# Altium footprint library MH_DA_THU_VIEN_16122016.PcbLib: 531 footprints (part 28 of 34)
Each footprint in its own frame and in the unit in brackets; x right, y up, seen from the top. Pads: shape width x height; smd on the part's side, far side on the other; paste and mask are expansions set on the pad; w line width, h text height; cw(c..) or ccw(c..) is an arc to the next point about the centre after c.
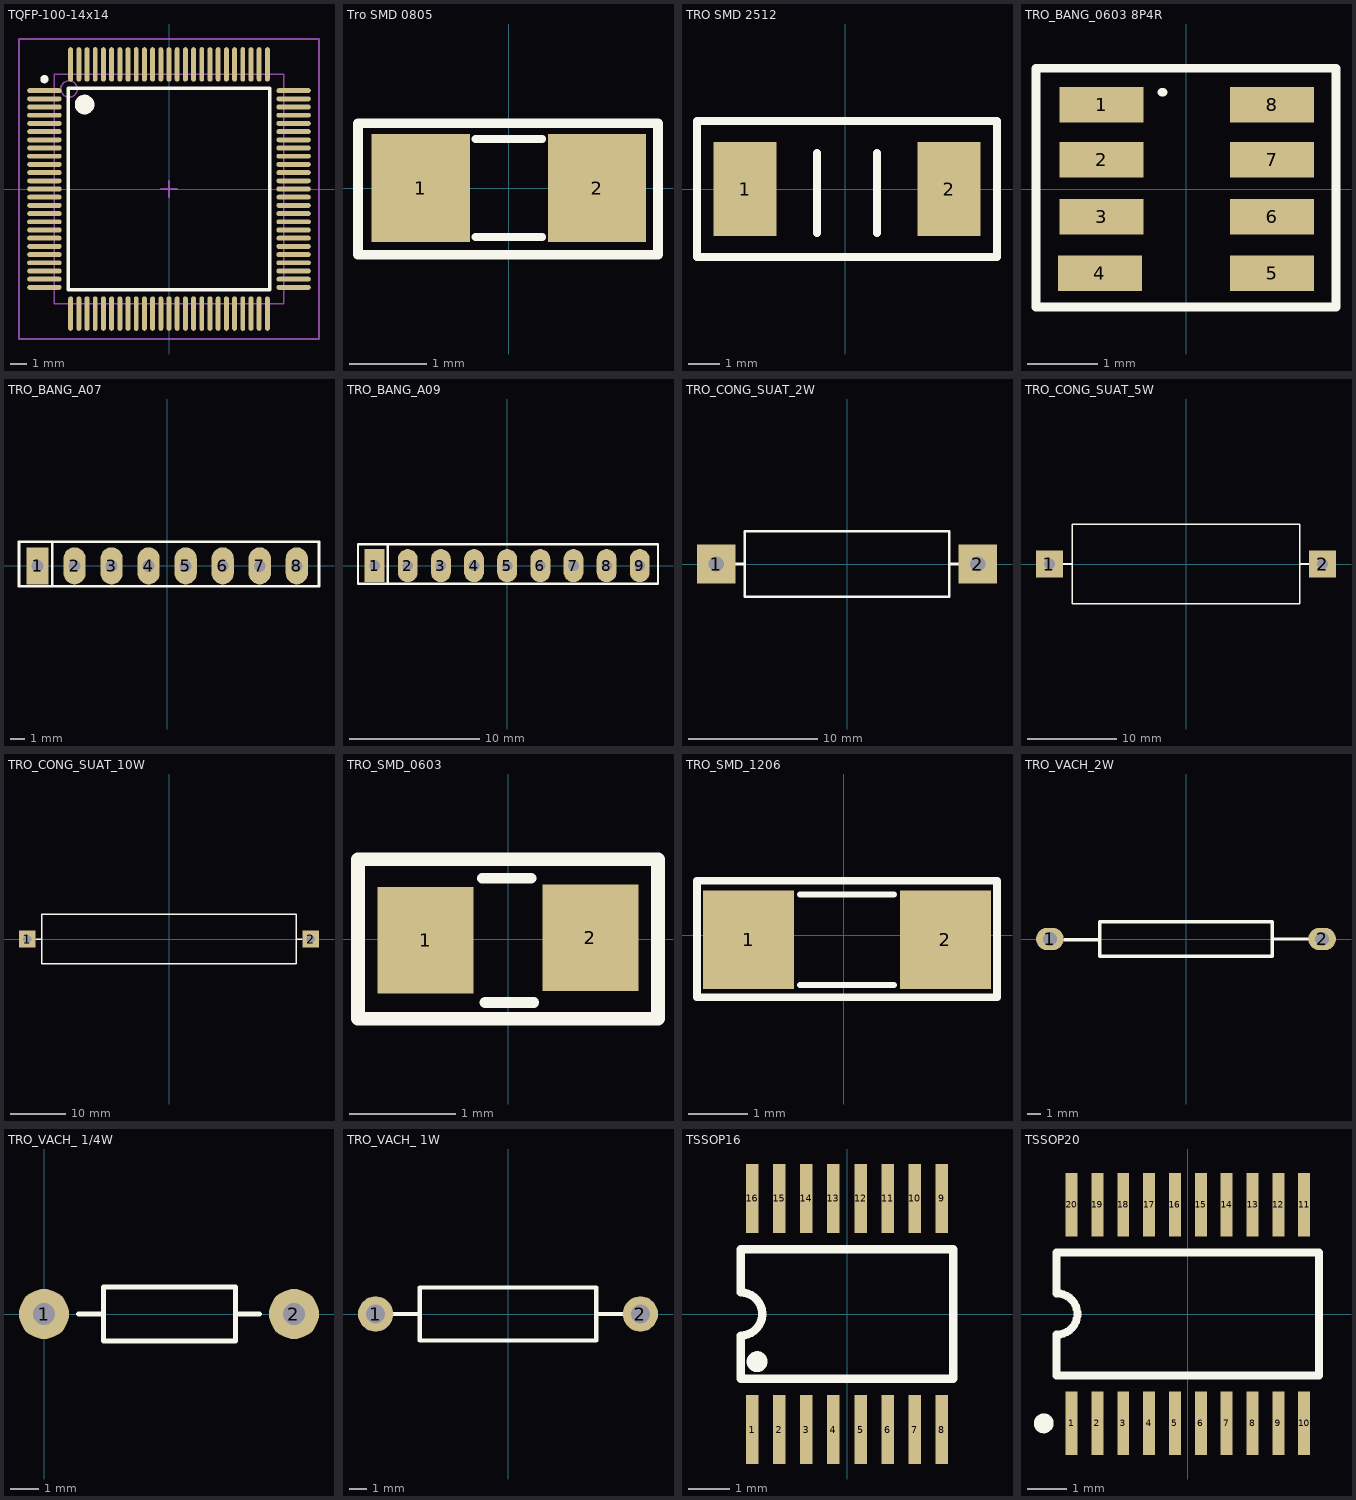
[diagram p27: the footprints below, top view; thin cyan lines are the x and y axes]

## TQFP-100-14x14 [mm] "Thin QFP, 100-Leads, Body 14x14mm, Pitch 0.5mm, IPC Low Density"
height 1.6
pads (100):
  oval 2.1x0.3 smd: 1(-7.6,6) 2(-7.6,5.5) 3(-7.6,5) 4(-7.6,4.5) 5(-7.6,4) 6(-7.6,3.5) 7(-7.6,3) 8(-7.6,2.5) 9(-7.6,2) 10(-7.6,1.5) 11(-7.6,1) 12(-7.6,0.5) 13(-7.6,0) 14(-7.6,-0.5) 15(-7.6,-1) 16(-7.6,-1.5) 17(-7.6,-2) 18(-7.6,-2.5) 19(-7.6,-3) 20(-7.6,-3.5) 21(-7.6,-4) 22(-7.6,-4.5) 23(-7.6,-5) 24(-7.6,-5.5) 25(-7.6,-6) 51(7.6,-6) 52(7.6,-5.5) 53(7.6,-5) 54(7.6,-4.5) 55(7.6,-4) 56(7.6,-3.5) 57(7.6,-3) 58(7.6,-2.5) 59(7.6,-2) 60(7.6,-1.5) 61(7.6,-1) 62(7.6,-0.5) 63(7.6,0) 64(7.6,0.5) 65(7.6,1) 66(7.6,1.5) 67(7.6,2) 68(7.6,2.5) 69(7.6,3) 70(7.6,3.5) 71(7.6,4) 72(7.6,4.5) 73(7.6,5) 74(7.6,5.5) 75(7.6,6)
  oval 0.3x2.1 smd: 26(-6,-7.6) 27(-5.5,-7.6) 28(-5,-7.6) 29(-4.5,-7.6) 30(-4,-7.6) 31(-3.5,-7.6) 32(-3,-7.6) 33(-2.5,-7.6) 34(-2,-7.6) 35(-1.5,-7.6) 36(-1,-7.6) 37(-0.5,-7.6) 38(0,-7.6) 39(0.5,-7.6) 40(1,-7.6) 41(1.5,-7.6) 42(2,-7.6) 43(2.5,-7.6) 44(3,-7.6) 45(3.5,-7.6) 46(4,-7.6) 47(4.5,-7.6) 48(5,-7.6) 49(5.5,-7.6) 50(6,-7.6) 76(6,7.6) 77(5.5,7.6) 78(5,7.6) 79(4.5,7.6) 80(4,7.6) 81(3.5,7.6) 82(3,7.6) 83(2.5,7.6) 84(2,7.6) 85(1.5,7.6) 86(1,7.6) 87(0.5,7.6) 88(0,7.6) 89(-0.5,7.6) 90(-1,7.6) 91(-1.5,7.6) 92(-2,7.6) 93(-2.5,7.6) 94(-3,7.6) 95(-3.5,7.6) 96(-4,7.6) 97(-4.5,7.6) 98(-5,7.6) 99(-5.5,7.6) 100(-6,7.6)
Top Overlay:
  circle w0.6: c-5.15,5.15 r0.3
  circle w0.25: c-7.6,6.7 r0.125
  lines w0.2: -6.15,-6.15 6.15,-6.15 6.15,6.15 -6.15,6.15 -6.15,-6.15
Mechanical 13:
  circle w0.1: c-6.1,6.1 r0.5
  lines w0.1: -7,-7 7,-7 7,7 -7,7 -7,-7
Mechanical 15:
  lines w0.1: -0.5,0 0.5,0 ; 0,-0.5 0,0.5 ; -9.15,-9.15 9.15,-9.15 9.15,9.15 -9.15,9.15 -9.15,-9.15
3D body: height 1.6, standoff 0, extent -7,-7 7,7

## Tro SMD 0805 [mil]
pads (2):
  rect 50x55 smd: 1(-45,0) 2(45,0)
Top Overlay:
  lines w4: -17,-25 17,-25 ; -17,25 17,25
  lines w5: -77,-34 -77,33 76,33 76,-34 -77,-34
3D body: height 20.79, standoff 0, extent -61.67,-27.65 56.44,27.47

## TRO SMD 2512 [mm]
pads (2):
  rect 2x3 smd: 1(-3.175,0) 2(3.302,0)
Top Overlay:
  lines w0.254: -0.889,-1.397 -0.889,1.143 ; 1.016,-1.397 1.016,1.143 ; -4.699,-2.159 -4.699,1.778 -4.699,2.159 4.826,2.159 4.826,-2.159 -4.699,-2.159
3D body: height 0.62, standoff 0, extent 5.476,-6.299 11.796,-3.099
3D body: height 0.62, standoff 0, extent 14.239,-2.362 20.559,0.838
3D body: height 0.64, standoff 0, extent 12.591,-2.035 19.391,1.265
3D body: height 0.64, standoff 0, extent 11.321,0.505 18.121,3.805
3D body: height 0.45, standoff 0, extent 15.383,-4.437 17.383,-3.437
3D body: height 0.64, standoff 0, extent -3.284,-1.654 3.516,1.646

## TRO_BANG_0603 8P4R [mil]
pads (8):
  rect 47.24x20 smd: 1(-47.5,47.5) 2(-47.5,16.5) 3(-47.5,-15.5) 4(-48.5,-47.5) 5(48.5,-47.5) 6(48.5,-15.5) 7(48.5,16.5) 8(48.5,47.5)
Top Overlay:
  lines w5: -13.5,54.5 -13,54.5 ; -84.5,-66.5 -84.5,68 -34.5,68 84.5,68 84.5,-66.5 -84.5,-66.5
3D body: height 21.65, standoff 0, extent -31,-60.49 32,65.5

## TRO_BANG_A07 [mil]
pads (8):
  rect 60x100 hole 32: 1(-350,0)
  oval 60x100 hole 32: 2(-250,0) 3(-150,0) 4(-50,0) 5(50,0) 6(150,0) 7(250,0) 8(350,0)
Top Overlay:
  lines w7: -310,-55 -310,65 ; -400,-55 410,-55 410,65 -400,65 -400,-55

## TRO_BANG_A09 [mil] "R SIP8, 9 Pin"
height 200
pads (9):
  rect 60x100 hole 32: 1(-400,0)
  oval 60x100 hole 32: 2(-300,0) 3(-200,0) 4(-100,0) 5(0,0) 6(100,0) 7(200,0) 8(300,0) 9(400,0)
Top Overlay:
  lines w7: -360,-55 -360,65 ; -450,-55 -450,65 455,65 455,-55 -450,-55
3D body: height 259.29, standoff -75.35, extent -442.91,-44.21 442.91,5

## TRO_CONG_SUAT_2W [mm]
pads (2):
  rect 3x3 hole 1.2: 1(-10.16,0) 2(10.16,0)
Top Overlay:
  lines w0.203: -7.938,-2.54 -7.938,2.54 ; -7.938,-2.54 7.938,-2.54 ; -7.938,-2.54 -7.938,2.54 ; -7.938,-2.54 7.938,-2.54 ; -7.938,2.54 7.938,2.54 ; -7.938,2.54 7.938,2.54 ; 7.938,-2.54 7.938,2.54 ; 7.938,-2.54 7.938,2.54 ; -8.89,0 -7.938,0 -8.89,0 ; 7.938,0 8.89,0 7.938,0
3D body: height 5.08, standoff 0, extent -7.938,-2.54 7.938,2.54

## TRO_CONG_SUAT_5W [mm]
pads (2):
  rect 3x3 hole 1.2: 1(-15.24,0) 2(15.24,0)
Top Overlay:
  lines w0.203: -12.7,-4.445 12.7,-4.445 ; -12.7,-4.445 -12.7,4.445 ; -12.7,-4.445 12.7,-4.445 ; -12.7,-4.445 -12.7,4.445 ; -12.7,4.445 12.7,4.445 ; -12.7,4.445 12.7,4.445 ; 12.7,-4.445 12.7,4.445 ; 12.7,-4.445 12.7,4.445 ; -13.97,0 -12.7,0 -13.97,0 ; 12.7,0 13.97,0 12.7,0
3D body: height 7.62, standoff 0, extent -12.7,-4.445 12.7,4.445

## TRO_CONG_SUAT_10W [mm]
pads (2):
  rect 3x3 hole 1.5: 1(-25.4,0) 2(25.4,0)
Top Overlay:
  lines w0.254: -23.876,0 -22.86,0 ; 22.86,0 23.876,0 ; -22.86,-4.445 -22.86,4.445 22.86,4.445 22.86,-4.445 -22.86,-4.445
3D body: height 7.62, standoff 0, extent -22.86,-4.445 22.86,4.445

## TRO_SMD_0603 [mm]
pads (2):
  rect 0.9x1 smd: 1(-0.775,-0.013) 2(0.775,0.013)
Top Overlay:
  lines w0.102: -0.241,0.572 0.216,0.572 ; -0.216,-0.597 0.241,-0.597
  lines w0.127: -1.41,-0.749 -1.41,0.749 1.41,0.749 1.41,-0.749 -1.41,-0.749
3D body: height 0.61, standoff -0.01, extent -1.073,-0.622 0.947,0.648

## TRO_SMD_1206 [mil]
pads (2):
  rect 60x65 smd: 1(-63,-3) 2(67,-3)
Top Overlay:
  lines w4: -29,-33 33,-33 ; -29,27 33,27
  lines w5: -97,-41 -97,36 101,36 101,-41 -97,-41
3D body: height 24.79, standoff 0, extent -80.68,-38 84.68,32.87

## TRO_VACH_2W [mil]
pads (2):
  oval 80x65 hole 40: 1(-393.7,0) 2(393.7,0)
Top Overlay:
  lines w10: -351,-2 -250,-2 -250,-50 250,-50 250,50 -250,50 -250,0 -251,-1 ; 250,0 354,0
3D body: height 216.54, standoff -118.11, extent -413.78,-110 413.78,106.54

## TRO_VACH_ 1/4W [mil] "R 1/4W, 2 Pin, 350mil"
height 100
pads (2):
  round 70 hole 31: 1(0,0) 2(350,0)
Top Overlay:
  lines w7: 48,0 83,0 ; 268,0 302,0 ; 83,-38 268,-38 268,38 83,38 83,-38
3D body: height 111.42, standoff -50, extent -39.6,-47 385.6,47.49

## TRO_VACH_ 1W [mil]
pads (2):
  round 80 hole 43.31: 1(-300,0) 2(300,0)
Top Overlay:
  lines w10: -300,0 -200,0 ; 200,0 300,0 ; -200,-60 200,-60 200,60 -200,60 -200,-60
3D body: height 196.85, standoff -196.85, extent -318.78,-98.42 308.78,98.43

## TSSOP16 [mm] "Shrink Small Outline; 16 Leads; Body Width 4.4 mm; Pitch 0.65 mm"
height 1.1
pads (16):
  rect 0.3x1.65 smd: 1(-2.275,-2.775) 2(-1.625,-2.775) 3(-0.975,-2.775) 4(-0.325,-2.775) 5(0.325,-2.775) 6(0.975,-2.775) 7(1.625,-2.775) 8(2.275,-2.775) 9(2.275,2.775) 10(1.625,2.775) 11(0.975,2.775) 12(0.325,2.775) 13(-0.325,2.775) 14(-0.975,2.775) 15(-1.625,2.775) 16(-2.275,2.775)
Top Overlay:
  circle w0.25: c-2.157,-1.143 r0.125
  lines w0.2: -2.55,-1.55 2.55,-1.55 2.55,1.55 -2.55,1.55 -2.55,0.517 cw(c-2.55,0) -2.55,-0.517 -2.55,-1.55

## TSSOP20 [mm] "Shrink Small Outline; 20 Leads; Body Width 4.4 mm; Pitch 0.65 mm"
height 1.1
pads (20):
  rect 0.3x1.6 smd: 1(-2.925,-2.75) 2(-2.275,-2.75) 3(-1.625,-2.75) 4(-0.975,-2.75) 5(-0.325,-2.75) 6(0.325,-2.75) 7(0.975,-2.75) 8(1.625,-2.75) 9(2.275,-2.75) 10(2.925,-2.75) 11(2.925,2.75) 12(2.275,2.75) 13(1.625,2.75) 14(0.975,2.75) 15(0.325,2.75) 16(-0.325,2.75) 17(-0.975,2.75) 18(-1.625,2.75) 19(-2.275,2.75) 20(-2.925,2.75)
Top Overlay:
  circle w0.25: c-3.625,-2.75 r0.125
  lines w0.2: -3.3,-1.55 -3.3,-0.52 ccw(c-3.3,0) -3.3,0.52 -3.3,1.55 3.3,1.55 3.3,-1.55 -3.3,-1.55
3D body: height 1.12, standoff -0.08, extent -3.3,-3.3 3.3,3.3